# Altium footprint library ESKDPcbLib.PcbLib: 608 footprints (part 23 of 38)
Each footprint in its own frame and in the unit in brackets; x right, y up, seen from the top. Pads: shape width x height; smd on the part's side, far side on the other; paste and mask are expansions set on the pad; w line width, h text height; cw(c..) or ccw(c..) is an arc to the next point about the centre after c.
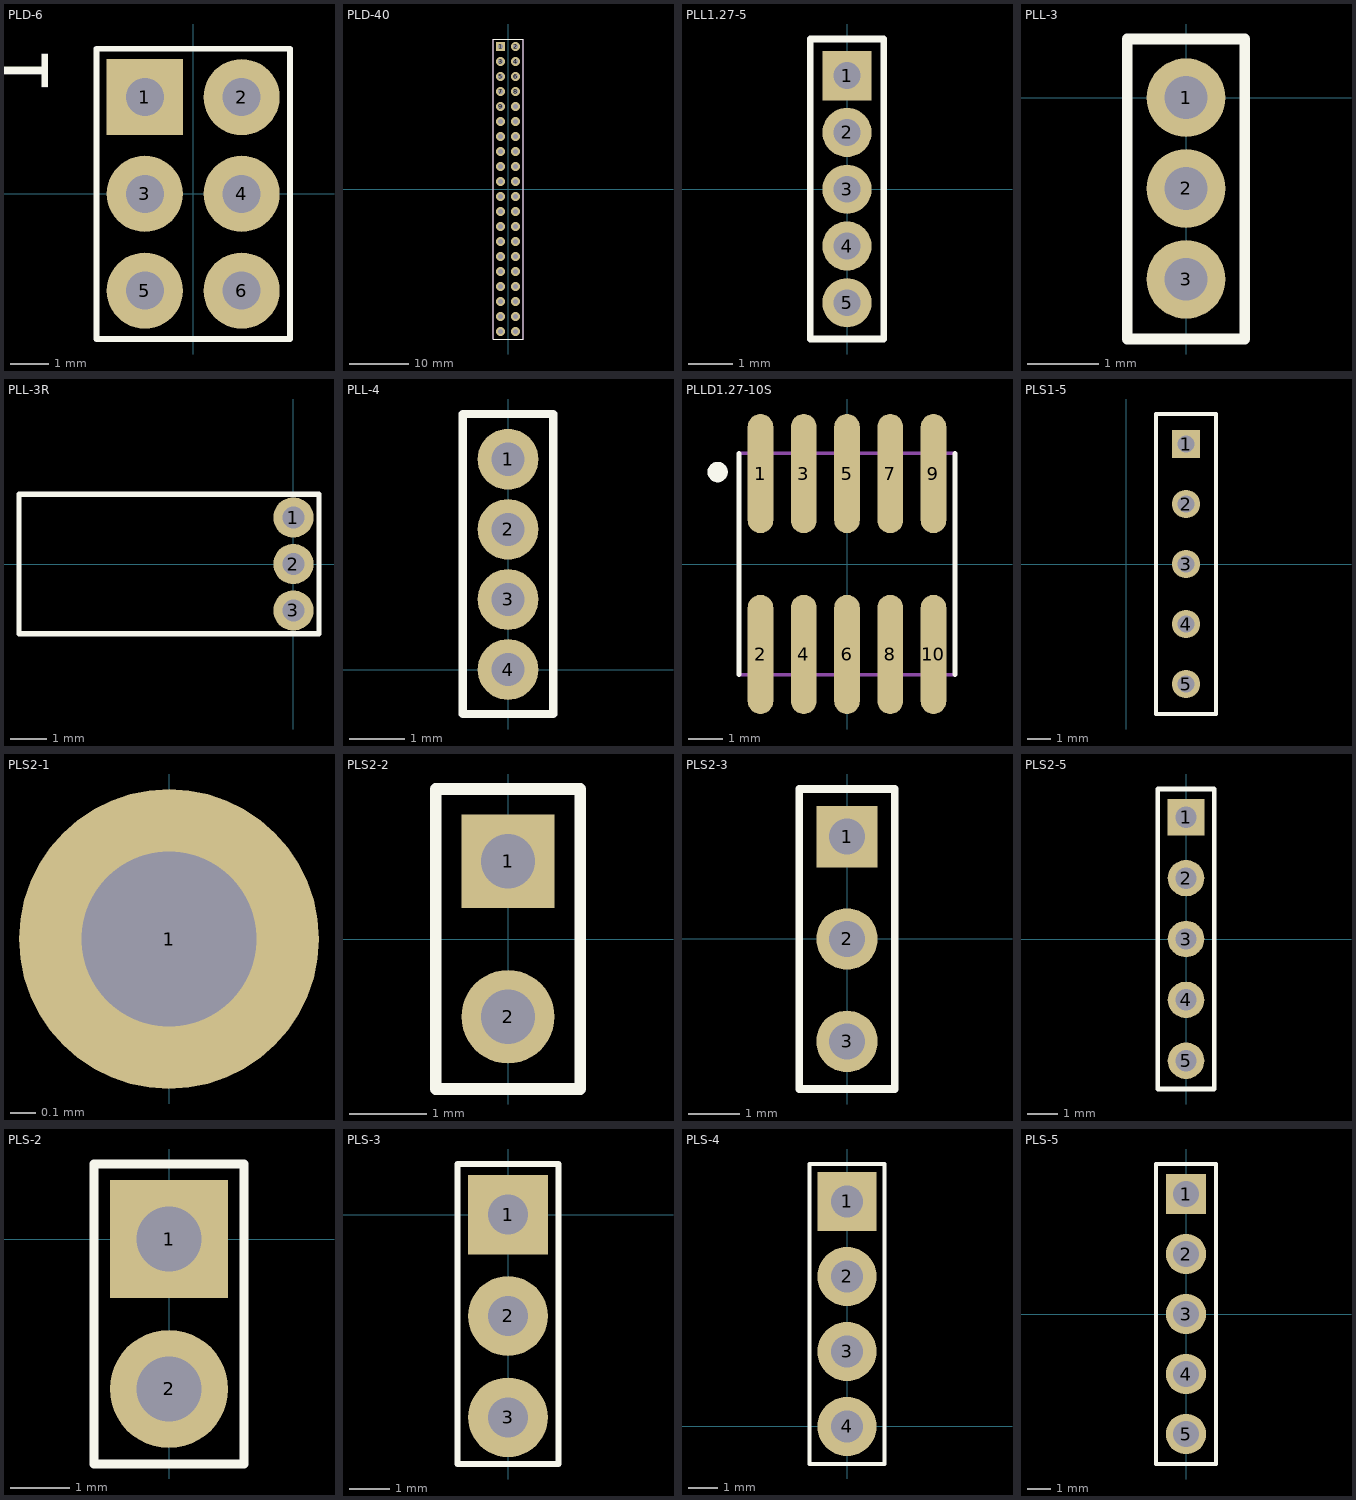
[diagram p22: the footprints below, top view; thin cyan lines are the x and y axes]

## PLD-6 [mm]
pads (6):
  rect 2x2 hole 1: 1(-1.27,2.54)
  round 2 hole 1: 2(1.27,2.54) 3(-1.27,0) 4(1.27,0) 5(-1.27,-2.54) 6(1.27,-2.54)
Top Overlay:
  lines w0.15: -2.54,-3.81 -2.54,3.81 2.54,3.81 2.54,-3.81 -2.54,-3.81
  text "1" at -3.81,2.54 h1.52
Mechanical 7:
  lines w0.1: -2.54,-3.81 -2.54,3.81 2.54,3.81 2.54,-3.81 -2.54,-3.81
Mechanical 10:
  text ".Comment" at -0.43,4.35 h0.6
  text ".Designator" at -0.54,5.08 h0.8
3D body "PLD-6.step": height 8.5, standoff -3, extent -2.5,-3.81 2.5,3.81

## PLD-40 [mm]
height 0.05
pads (40):
  rect 1.5x1.5 hole 0.9: 1(-1.27,24.13)
  round 1.5 hole 0.9: 2(1.27,24.13) 3(-1.27,21.59) 4(1.27,21.59) 5(-1.27,19.05) 6(1.27,19.05) 7(-1.27,16.51) 8(1.27,16.51) 9(-1.27,13.97) 10(1.27,13.97) 11(-1.27,11.43) 12(1.27,11.43) 13(-1.27,8.89) 14(1.27,8.89) 15(-1.27,6.35) 16(1.27,6.35) 17(-1.27,3.81) 18(1.27,3.81) 19(-1.27,1.27) 20(1.27,1.27) 21(-1.27,-1.27) 22(1.27,-1.27) 23(-1.27,-3.81) 24(1.27,-3.81) 25(-1.27,-6.35) 26(1.27,-6.35) 27(-1.27,-8.89) 28(1.27,-8.89) 29(-1.27,-11.43) 30(1.27,-11.43) 31(-1.27,-13.97) 32(1.27,-13.97) 33(-1.27,-16.51) 34(1.27,-16.51) 35(-1.27,-19.05) 36(1.27,-19.05) 37(-1.27,-21.59) 38(1.27,-21.59) 39(-1.27,-24.13) 40(1.27,-24.13)
Top Overlay:
  lines w0.15: -2.54,-25.4 2.54,-25.4 2.54,25.4 -2.54,25.4 -2.54,-25.4
Mechanical 7:
  lines w0.1: -2.54,-25.4 -2.54,25.4 2.54,25.4 2.54,-25.4 -2.54,-25.4
Mechanical 10:
  text ".Comment" at -0.43,25.94 h0.6
  text ".Designator" at -0.54,26.67 h0.8
3D body "PLS-1.STEP": height 8.44, standoff -3, extent -2.54,-15.24 0,-12.7
3D body "PLS-1.STEP": height 8.44, standoff -3, extent -2.54,-17.78 0,-15.24
3D body "PLS-1.STEP": height 8.44, standoff -3, extent 0,-15.24 2.54,-12.7
3D body "PLS-1.STEP": height 8.44, standoff -3, extent 0,-17.78 2.54,-15.24
3D body "PLS-1.STEP": height 8.44, standoff -3, extent -2.54,-20.32 0,-17.78
3D body "PLS-1.STEP": height 8.44, standoff -3, extent 0,-20.32 2.54,-17.78
3D body "PLS-1.STEP": height 8.44, standoff -3, extent -2.54,-22.86 0,-20.32
3D body "PLS-1.STEP": height 8.44, standoff -3, extent 0,-22.86 2.54,-20.32
3D body "PLS-1.STEP": height 8.44, standoff -3, extent -2.54,-25.4 0,-22.86
3D body "PLS-1.STEP": height 8.44, standoff -3, extent 0,-25.4 2.54,-22.86
3D body "PLS-1.STEP": height 8.44, standoff -3, extent -2.54,-2.54 0,0
3D body "PLS-1.STEP": height 8.44, standoff -3, extent -2.54,-5.08 0,-2.54
3D body "PLS-1.STEP": height 8.44, standoff -3, extent 0,-2.54 2.54,0
3D body "PLS-1.STEP": height 8.44, standoff -3, extent 0,-5.08 2.54,-2.54
3D body "PLS-1.STEP": height 8.44, standoff -3, extent -2.54,-7.62 0,-5.08
3D body "PLS-1.STEP": height 8.44, standoff -3, extent 0,-7.62 2.54,-5.08
3D body "PLS-1.STEP": height 8.44, standoff -3, extent -2.54,-10.16 0,-7.62
3D body "PLS-1.STEP": height 8.44, standoff -3, extent 0,-10.16 2.54,-7.62
3D body "PLS-1.STEP": height 8.44, standoff -3, extent -2.54,-12.7 0,-10.16
3D body "PLS-1.STEP": height 8.44, standoff -3, extent 0,-12.7 2.54,-10.16
3D body "PLS-1.STEP": height 8.44, standoff -3, extent -2.54,10.16 0,12.7
3D body "PLS-1.STEP": height 8.44, standoff -3, extent -2.54,7.62 0,10.16
3D body "PLS-1.STEP": height 8.44, standoff -3, extent 0,10.16 2.54,12.7
3D body "PLS-1.STEP": height 8.44, standoff -3, extent 0,7.62 2.54,10.16
3D body "PLS-1.STEP": height 8.44, standoff -3, extent -2.54,5.08 0,7.62
3D body "PLS-1.STEP": height 8.44, standoff -3, extent 0,5.08 2.54,7.62
3D body "PLS-1.STEP": height 8.44, standoff -3, extent -2.54,2.54 0,5.08
3D body "PLS-1.STEP": height 8.44, standoff -3, extent 0,2.54 2.54,5.08
3D body "PLS-1.STEP": height 8.44, standoff -3, extent -2.54,0 0,2.54
3D body "PLS-1.STEP": height 8.44, standoff -3, extent 0,0 2.54,2.54
3D body "PLS-1.STEP": height 8.44, standoff -3, extent 0,12.7 2.54,15.24
3D body "PLS-1.STEP": height 8.44, standoff -3, extent -2.54,12.7 0,15.24
3D body "PLS-1.STEP": height 8.44, standoff -3, extent 0,15.24 2.54,17.78
3D body "PLS-1.STEP": height 8.44, standoff -3, extent -2.54,15.24 0,17.78
3D body "PLS-1.STEP": height 8.44, standoff -3, extent 0,17.78 2.54,20.32
3D body "PLS-1.STEP": height 8.44, standoff -3, extent -2.54,17.78 0,20.32
3D body "PLS-1.STEP": height 8.44, standoff -3, extent 0,20.32 2.54,22.86
3D body "PLS-1.STEP": height 8.44, standoff -3, extent 0,22.86 2.54,25.4
3D body "PLS-1.STEP": height 8.44, standoff -3, extent -2.54,20.32 0,22.86
3D body "PLS-1.STEP": height 8.44, standoff -3, extent -2.54,22.86 0,25.4

## PLL1.27-5 [mm]
height 0.05
pads (5):
  rect 1.1x1.1 hole 0.6: 1(0,2.54)
  round 1.1 hole 0.6: 2(0,1.27) 3(0,0) 4(0,-1.27) 5(0,-2.54)
Top Overlay:
  lines w0.15: -0.82,-3.35 0.82,-3.35 0.82,3.36 -0.82,3.36 -0.82,-3.35
Mechanical 7:
  lines w0.1: -0.82,-3.35 0.82,-3.35 0.82,3.36 -0.82,3.36 -0.82,-3.35
Mechanical 10:
  text ".Designator" at -0.4,3.76 h0.8
  text ".Comment" at -0.34,-4.16 h0.6
3D body: height 0.05, standoff 0, extent -0.82,-3.35 0.82,3.36

## PLL-3 [mm]
pads (3):
  round 1.1 hole 0.6: 1(0,0) 2(0,-1.27) 3(0,-2.54)
Top Overlay:
  lines w0.15: -0.82,-3.375 0.82,-3.375 0.82,0.82 -0.82,0.82 -0.82,-3.375
Mechanical 7:
  lines w0.1: -0.82,-3.375 -0.82,0.82 0.82,0.82 0.82,-3.375 -0.82,-3.375

## PLL-3R [mm]
pads (3):
  round 1.1 hole 0.6: 1(0,1.27) 2(0,0) 3(0,-1.27)
Top Overlay:
  lines w0.15: -7.5,-1.9 -7.5,1.9 0.7,1.9 0.7,-1.9 -7.5,-1.9
Mechanical 7:
  lines w0.1: -7.5,-1.9 -7.5,1.9 0.7,1.9 0.7,-1.9 -7.5,-1.9

## PLL-4 [mm]
pads (4):
  round 1.1 hole 0.6: 1(0,3.81) 2(0,2.54) 3(0,1.27) 4(0,0)
Top Overlay:
  lines w0.15: -0.82,-0.805 -0.82,4.63 0.82,4.63 0.82,-0.805 -0.82,-0.805
Mechanical 7:
  lines w0.1: -0.82,-0.805 0.82,-0.805 0.82,4.63 -0.82,4.63 -0.82,-0.805

## PLLD1.27-10S [mm] "PLDD-1.27"
height 5
pads (10):
  oval 0.75x3.5 smd: 1(-2.54,2.655) 2(-2.54,-2.655) 3(-1.27,2.655) 4(-1.27,-2.655) 5(0,2.655) 6(0,-2.655) 7(1.27,2.655) 8(1.27,-2.655) 9(2.54,2.655) 10(2.54,-2.655)
Top Overlay:
  circle w0.3: c-3.8,2.7 r0.15
  lines w0.15: -3.175,-3.25 -3.175,3.25 ; 3.175,-3.25 3.175,3.25
Mechanical 7:
  lines w0.1: -3.175,-3.25 -3.175,3.25 3.175,3.25 3.175,-3.25 -3.175,-3.25
3D body: height 5, standoff 0, extent -3.175,-3.25 3.175,3.25

## PLS1-5 [mm]
pads (5):
  rect 1.2x1.2 hole 0.7: 1(2.54,5.08)
  round 1.2 hole 0.7: 2(2.54,2.54) 3(2.54,0) 4(2.54,-2.54) 5(2.54,-5.08)
Top Overlay:
  lines w0.15: 1.27,-6.35 3.81,-6.35 3.81,6.35 1.27,6.35 1.27,-6.35
Mechanical 7:
  lines w0.1: 1.27,-6.35 3.81,-6.35 3.81,6.35 1.27,6.35 1.27,-6.35

## PLS2-1 [mm]
height 0.05
pads (1):
  round 1.2 hole 0.7: 1(0,-1)
Mechanical 10:
  text ".Designator" at -0.55,0.075 h0.8
  text ".Comment" at -0.5,-2.275 h0.6

## PLS2-2 [mm]
height 0.05
pads (2):
  rect 1.2x1.2 hole 0.7: 1(0,1)
  round 1.2 hole 0.7: 2(0,-1)
Top Overlay:
  lines w0.15: -0.93,-1.93 0.93,-1.93 0.93,1.93 -0.93,1.93 -0.93,-1.93
Mechanical 7:
  lines w0.1: -0.93,-1.93 0.93,-1.93 0.93,1.93 -0.93,1.93 -0.93,-1.93
Mechanical 10:
  text ".Comment" at -0.6,-2.62 h0.6
  text ".Designator" at -0.55,2.34 h0.8

## PLS2-3 [mm]
height 0.05
pads (3):
  rect 1.2x1.2 hole 0.7: 1(0,2)
  round 1.2 hole 0.7: 2(0,0) 3(0,-2)
Top Overlay:
  lines w0.15: -0.93,-2.93 0.93,-2.93 0.93,2.93 -0.93,2.93 -0.93,-2.93
Mechanical 7:
  lines w0.1: -0.93,-2.93 0.93,-2.93 0.93,2.93 -0.93,2.93 -0.93,-2.93
Mechanical 10:
  text ".Designator" at -0.55,3.34 h0.8
  text ".Comment" at -0.6,-3.5 h0.6

## PLS2-5 [mm]
height 0.05
pads (5):
  rect 1.2x1.2 hole 0.7: 1(0,4)
  round 1.2 hole 0.7: 2(0,2) 3(0,0) 4(0,-2) 5(0,-4)
Top Overlay:
  lines w0.15: -0.93,-4.93 -0.93,4.93 0.93,4.93 0.93,-4.93 -0.93,-4.93
Mechanical 7:
  lines w0.1: -0.93,-4.93 -0.93,4.93 0.93,4.93 0.93,-4.93 -0.93,-4.93
Mechanical 10:
  text ".Comment" at -0.45,-5.59 h0.6
  text ".Designator" at -0.55,5.34 h0.8

## PLS-2 [mm]
pads (2):
  rect 2x2 hole 1.1: 1(0,0)
  round 2 hole 1.1: 2(0,-2.54)
Top Overlay:
  lines w0.15: -1.27,-3.81 -1.27,1.27 1.27,1.27 1.27,-3.81 -1.27,-3.81
Mechanical 7:
  lines w0.1: -1.27,-3.81 -1.27,1.27 1.27,1.27 1.27,-3.81 -1.27,-3.81
3D body "PLS-1.STEP": height 8.44, standoff -3, extent -1.27,-1.27 1.27,1.27
3D body "PLS-1.STEP": height 8.44, standoff -3, extent -1.27,-3.81 1.27,-1.27

## PLS-3 [mm]
pads (3):
  rect 2x2 hole 1: 1(0,0)
  round 2 hole 1: 2(0,-2.54) 3(0,-5.08)
Top Overlay:
  lines w0.15: -1.27,-6.25 -1.27,1.27 1.27,1.27 1.27,-6.25 -1.27,-6.25
Mechanical 7:
  lines w0.1: -1.27,-6.25 -1.27,1.27 1.27,1.27 1.27,-6.25 -1.27,-6.25
Mechanical 10:
  text ".Comment" at 1.625,-0.4 h1
  text ".Designator" at 1.625,0.6 h1
3D body "PLS-1.STEP": height 8.44, standoff -3, extent -1.27,-1.27 1.27,1.27
3D body "PLS-1.STEP": height 8.44, standoff -3, extent -1.27,-3.81 1.27,-1.27
3D body "PLS-1.STEP": height 8.44, standoff -3, extent -1.27,-6.35 1.27,-3.81

## PLS-4 [mm]
height 0.05
pads (4):
  rect 2x2 hole 1.1: 1(0,7.62)
  round 2 hole 1.1: 2(0,5.08) 3(0,2.54)
  round 2 hole 1.1 mask+0.102: 4(0,0)
Top Overlay:
  lines w0.15: -1.27,-1.27 -1.27,8.89 1.27,8.89 1.27,-1.27 -1.27,-1.27
Mechanical 7:
  lines w0.1: -1.27,-1.27 -1.27,8.89 1.27,8.89 1.27,-1.27 -1.27,-1.27
Mechanical 10:
  text ".Comment" at 1.5,8.5 h0.6
  text ".Designator" at 1.5,9 h0.8
3D body "PLS-1.STEP": height 8.44, standoff -3, extent -1.27,-1.27 1.27,1.27
3D body "PLS-1.STEP": height 8.44, standoff -3, extent -1.27,1.27 1.27,3.81
3D body "PLS-1.STEP": height 8.44, standoff -3, extent -1.27,3.81 1.27,6.35
3D body "PLS-1.STEP": height 8.44, standoff -3, extent -1.27,6.35 1.27,8.89

## PLS-5 [mm]
pads (5):
  rect 1.7x1.7 hole 1.1: 1(0,5.08)
  round 1.7 hole 1.1: 2(0,2.54) 3(0,0) 4(0,-2.54) 5(0,-5.08)
Top Overlay:
  lines w0.15: -1.27,-6.35 -1.27,6.35 1.27,6.35 1.27,-6.35 -1.27,-6.35
Mechanical 7:
  lines w0.1: -1.27,-6.35 -1.27,6.35 1.27,6.35 1.27,-6.35 -1.27,-6.35
Mechanical 10:
  text ".Designator" at 1.27,3.81 h1.52
  text ".Comment" at 1.27,5.08 h1.52
3D body: height 8.54, standoff -3, extent -1.27,-6.35 1.27,6.35